# Altium footprint library PCBLIB.PcbLib: 775 footprints (part 33 of 49)
Each footprint in its own frame and in the unit in brackets; x right, y up, seen from the top. Pads: shape width x height; smd on the part's side, far side on the other; paste and mask are expansions set on the pad; w line width, h text height; cw(c..) or ccw(c..) is an arc to the next point about the centre after c.
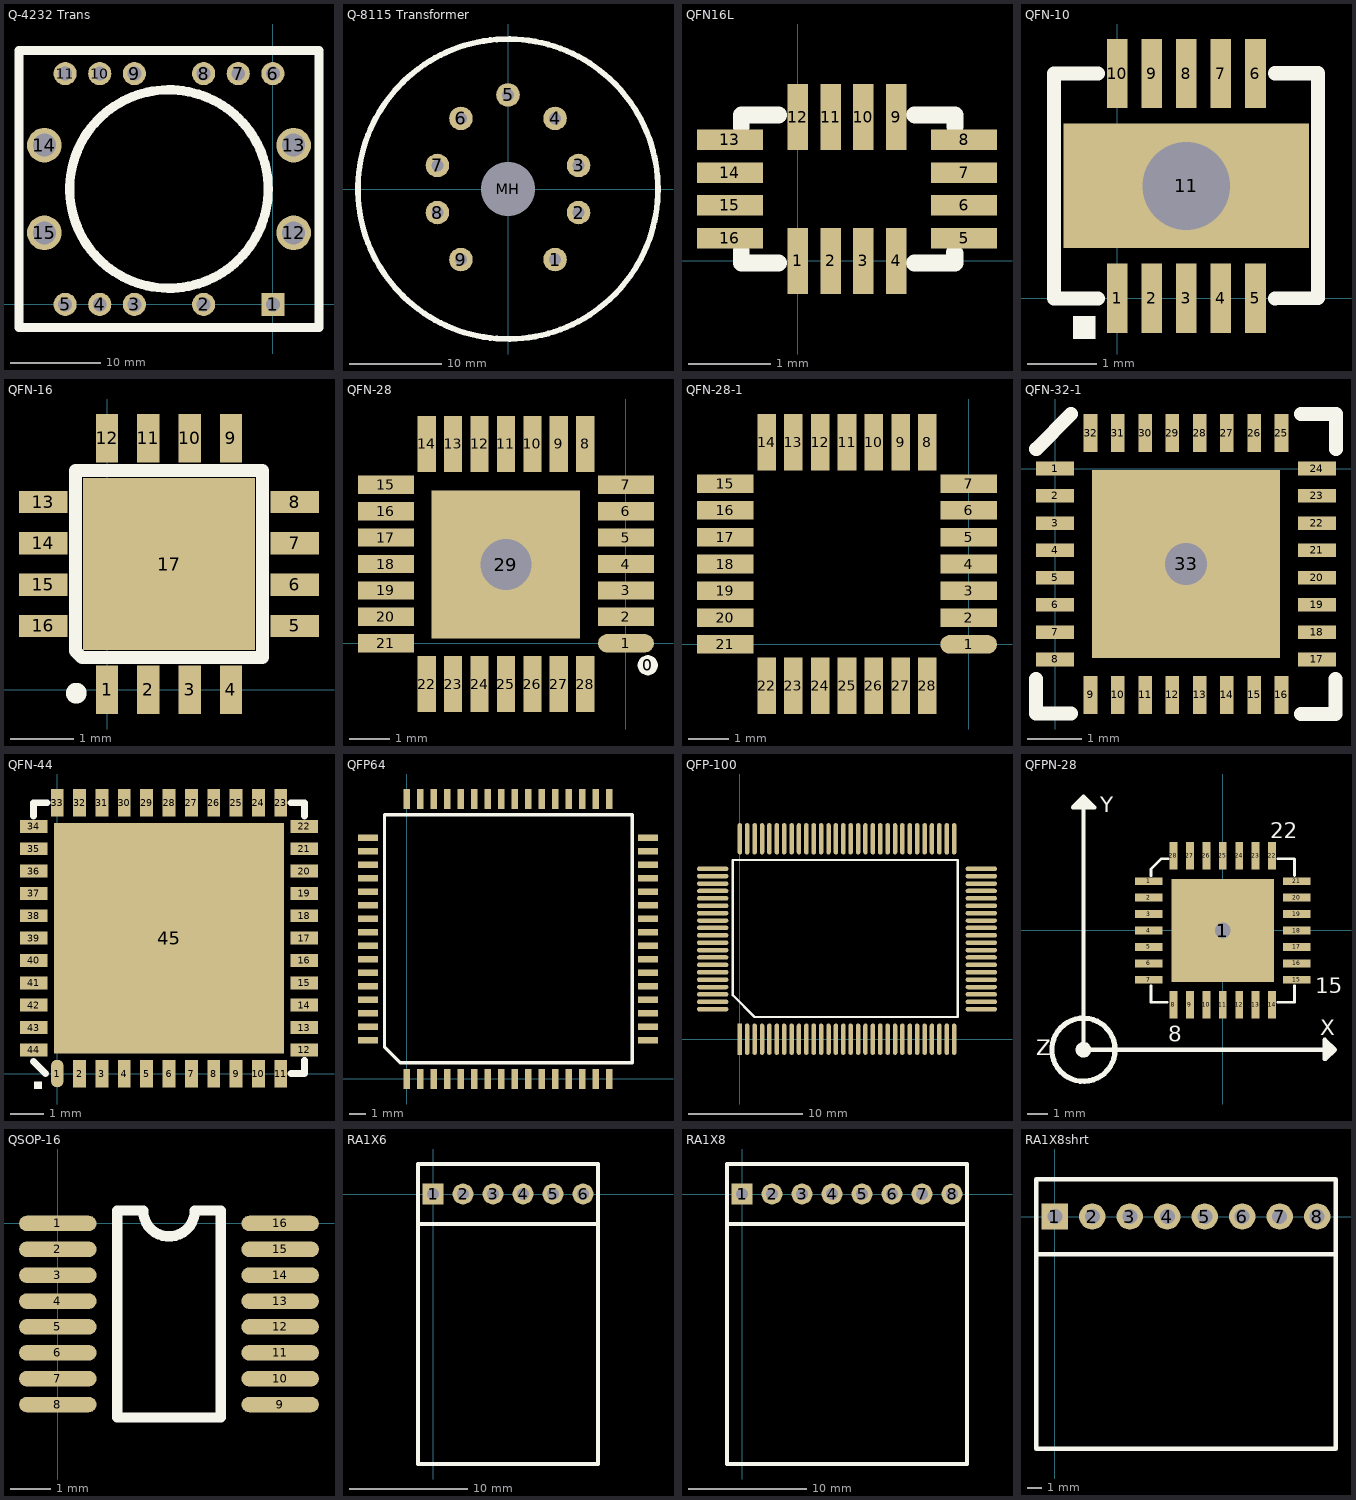
[diagram p32: the footprints below, top view; thin cyan lines are the x and y axes]

## Q-4232 Trans [mil]
pads (15):
  rect 100x100 hole 60: 1(0,0)
  round 100 hole 60: 2(-300,0) 3(-600,0) 4(-750,0) 5(-900,0) 6(0,1000) 7(-150,1000) 8(-300,1000) 9(-600,1000) 10(-750,1000) 11(-900,1000)
  round 150 hole 100: 12(90,310) 13(90,690) 14(-990,690) 15(-990,310)
TopOverlay:
  circle w40: c-450,500 r430
  lines w40: -1100,-100 -1100,1100 200,1100 200,-100 -1100,-100
Mechanical4:
  text "1.188" at 0,0 h1

## Q-8115 Transformer [mil] "Pot Core Audio Transformer with Additional Impedance Taps"
pads (10):
  round 100 hole 50: 1(200,-300) 2(300,-100) 3(300,100) 4(200,300) 5(0,400) 6(-200,300) 7(-300,100) 8(-300,-100) 9(-200,-300)
  round 100 hole 230 unplated: MH(0,0)
TopOverlay:
  circle w24: c0,0 r637.8
  text "." at 278,-379 h90
Mechanical4:
  text ".895" at 710,-140 h1

## QFN16L [mm]
height 0.45
pads (16):
  rect 0.25x0.8 smd: 1(0,0) 2(0.4,0) 3(0.8,0) 4(1.2,0) 9(1.2,1.75) 10(0.8,1.75) 11(0.4,1.75) 12(0,1.75)
  rect 0.8x0.25 smd: 5(2.025,0.275) 6(2.025,0.675) 7(2.025,1.075) 8(2.025,1.475) 13(-0.825,1.475) 14(-0.825,1.075) 15(-0.825,0.675) 16(-0.825,0.275)
TopOverlay:
  lines w0.203: -0.686,0.127 -0.686,-0.025 ; -0.686,1.626 -0.686,1.775 -0.232,1.775 -0.229,1.778 ; 1.422,1.778 1.425,1.775 1.914,1.775 1.914,1.635 ; 1.905,0.102 1.914,0.092 1.914,-0.025 1.423,-0.025 ; -0.686,-0.025 -0.685,-0.025 ; -0.685,-0.025 -0.559,-0.025 -0.229,-0.025 ; -0.229,-0.025 -0.229,-0.025 ; 1.422,-0.025 1.423,-0.025
  text "." at -0.457,-0.483 h0.76

## QFN-10 [mm]
height 1.016
pads (11):
  rect 0.3x1 smd: 1(0,0) 2(0.5,0) 3(1,0) 4(1.5,0) 5(2,0) 6(2,3.25) 7(1.5,3.25) 8(1,3.25) 9(0.5,3.25) 10(0,3.25)
  rect 3.556x1.8 / inner round 1.27 / far side round 1.778 hole 1.27: 11(1,1.625)
TopOverlay:
  rectangle: -0.635,-0.588 -0.311,-0.254
  lines w0.203: -0.28,0 -0.914,0.001 -0.914,3.249 -0.28,3.25 ; 2.28,0 2.905,0.005 2.905,3.255 2.281,3.255

## QFN-16 [mm]
height 1.016
pads (17):
  rect 0.35x0.76 smd: 1(0,0) 2(0.65,0) 3(1.3,0) 4(1.95,0) 9(1.95,3.96) 10(1.3,3.96) 11(0.65,3.96) 12(0,3.96)
  rect 0.76x0.35 smd: 5(2.955,1.005) 6(2.955,1.655) 7(2.955,2.305) 8(2.955,2.955) 13(-1.005,2.955) 14(-1.005,2.305) 15(-1.005,1.655) 16(-1.005,1.005)
  rect 2.7x2.7 smd: 17(0.975,1.98)
TopOverlay:
  circle w0.254: c-0.483,-0.052 r0.036
  lines w0.203: -0.498,0.61 -0.397,0.507 2.448,0.507 2.448,3.453 -0.498,3.453 -0.498,0.61

## QFN-28 [mil] "PIC16F87XA"
height 40
pads (30):
  round 20 on Top Overlay: 0(21.5,-21.55)
  oval 55x18 smd: 1(0,0)
  rect 55x18 smd: 2(0,26) 3(0,52) 4(0,78) 5(0,104) 6(0,130) 7(0,156) 15(-236,156) 16(-236,130) 17(-236,104) 18(-236,78) 19(-236,52) 20(-236,26) 21(-236,0)
  rect 18x55 smd: 8(-40,196) 9(-66,196) 10(-92,196) 11(-118,196) 12(-144,196) 13(-170,196) 14(-196,196) 22(-196,-40) 23(-170,-40) 24(-144,-40) 25(-118,-40) 26(-92,-40) 27(-66,-40) 28(-40,-40)
  rect 146x146 / inner round 50 / far side round 50 hole 50: 29(-118,77.5)

## QFN-28-1 [mil] "PIC16F87XA"
height 40
pads (28):
  oval 55x18 smd: 1(0,0)
  rect 55x18 smd: 2(0,26) 3(0,52) 4(0,78) 5(0,104) 6(0,130) 7(0,156) 15(-236,156) 16(-236,130) 17(-236,104) 18(-236,78) 19(-236,52) 20(-236,26) 21(-236,0)
  rect 18x55 smd: 8(-40,196) 9(-66,196) 10(-92,196) 11(-118,196) 12(-144,196) 13(-170,196) 14(-196,196) 22(-196,-40) 23(-170,-40) 24(-144,-40) 25(-118,-40) 26(-92,-40) 27(-66,-40) 28(-40,-40)

## QFN-32-1 [mm]
pads (33):
  rect 0.7x0.25 smd: 1(0,0) 2(0,-0.5) 3(0,-1) 4(0,-1.5) 5(0,-2) 6(0,-2.5) 7(0,-3) 8(0,-3.5) 17(4.8,-3.5) 18(4.8,-3) 19(4.8,-2.5) 20(4.8,-2) 21(4.8,-1.5) 22(4.8,-1) 23(4.8,-0.5) 24(4.8,0)
  rect 0.25x0.7 smd: 9(0.65,-4.15) 10(1.15,-4.15) 11(1.65,-4.15) 12(2.15,-4.15) 13(2.65,-4.15) 14(3.15,-4.15) 15(3.65,-4.15) 16(4.15,-4.15) 25(4.15,0.65) 26(3.65,0.65) 27(3.15,0.65) 28(2.65,0.65) 29(2.15,0.65) 30(1.65,0.65) 31(1.15,0.65) 32(0.65,0.65)
  rect 3.45x3.45 / inner round 1.27 / far side rect 1.27x1.27 hole 0.762: 33(2.4,-1.75)
TopOverlay:
  lines w0.254: -0.35,-3.86 -0.35,-4.49 0.29,-4.49 ; -0.35,0.36 -0.34,0.36 0.29,1 ; 4.51,-4.5 5.14,-4.5 5.14,-3.86 ; 4.51,1 5.15,1 5.15,0.36
  text "." at -0.53,0.94 h1.52

## QFN-44 [mil]
height 40
pads (45):
  oval 15x32 smd: 1(0,0)
  rect 15x32 smd: 2(26,0) 3(52,0) 4(78,0) 5(104,0) 6(130,0) 7(156,0) 8(182,0) 9(208,0) 10(234,0) 11(260,0) 23(260,315) 24(234,315) 25(208,315) 26(182,315) 27(156,315) 28(130,315) 29(104,315) 30(78,315) 31(52,315) 32(26,315) 33(0,315)
  rect 32x15 smd: 12(287.5,27.5) 13(287.5,53.5) 14(287.5,79.5) 15(287.5,105.5) 16(287.5,131.5) 17(287.5,157.5) 18(287.5,183.5) 19(287.5,209.5) 20(287.5,235.5) 21(287.5,261.5) 22(287.5,287.5) 34(-27.5,287.5) 35(-27.5,261.5) 36(-27.5,235.5) 37(-27.5,209.5) 38(-27.5,183.5) 39(-27.5,157.5) 40(-27.5,131.5) 41(-27.5,105.5) 42(-27.5,79.5) 43(-27.5,53.5) 44(-27.5,27.5)
  rect 268x268 smd: 45(130,157.5)
TopOverlay:
  rectangle: -27,-18 -18,-9
  lines w8: -27.5,299.5 -27.5,315 -12,315 ; 272,0 287.5,0 287.5,15.5 ; 272,315 287.5,315 287.5,299.5 ; -27.5,14 -13.5,0 -27.5,14

## QFP64 [mm]
height 1.016
pads (64):
  rect 0.4x1.2 smd: 1(0,0) 2(0.8,0) 3(1.6,0) 4(2.4,0) 5(3.2,0) 6(4,0) 7(4.8,0) 8(5.6,0) 9(6.4,0) 10(7.2,0) 11(8,0) 12(8.8,0) 13(9.6,0) 14(10.4,0) 15(11.2,0) 16(12,0) 33(12,16.6) 34(11.2,16.6) 35(10.4,16.6) 36(9.6,16.6) 37(8.8,16.6) 38(8,16.6) 39(7.2,16.6) 40(6.4,16.6) 41(5.6,16.6) 42(4.8,16.6) 43(4,16.6) 44(3.2,16.6) 45(2.4,16.6) 46(1.6,16.6) 47(0.8,16.6) 48(0,16.6)
  rect 1.2x0.4 smd: 17(14.3,2.3) 18(14.3,3.1) 19(14.3,3.9) 20(14.3,4.7) 21(14.3,5.5) 22(14.3,6.3) 23(14.3,7.1) 24(14.3,7.9) 25(14.3,8.7) 26(14.3,9.5) 27(14.3,10.3) 28(14.3,11.1) 29(14.3,11.9) 30(14.3,12.7) 31(14.3,13.5) 32(14.3,14.3) 49(-2.3,14.3) 50(-2.3,13.5) 51(-2.3,12.7) 52(-2.3,11.9) 53(-2.3,11.1) 54(-2.3,10.3) 55(-2.3,9.5) 56(-2.3,8.7) 57(-2.3,7.9) 58(-2.3,7.1) 59(-2.3,6.3) 60(-2.3,5.5) 61(-2.3,4.7) 62(-2.3,3.9) 63(-2.3,3.1) 64(-2.3,2.3)
TopOverlay:
  lines w0.2: -1.329,1.901 -1.329,15.666 13.381,15.666 13.381,0.956 -0.384,0.956 -1.329,1.901
  text "." at -0.127,1.422 h1.52

## QFP-100 [mm]
pads (100):
  rect 0.4x2.76 smd: 1(0,0)
  oval 0.4x2.76 smd: 2(0.65,0) 3(1.3,0) 4(1.95,0) 5(2.6,0) 6(3.25,0) 7(3.9,0) 8(4.55,0) 9(5.2,0) 10(5.85,0) 11(6.5,0) 12(7.15,0) 13(7.8,0) 14(8.45,0) 15(9.1,0) 16(9.75,0) 17(10.4,0) 18(11.05,0) 19(11.7,0) 20(12.35,0) 21(13,0) 22(13.65,0) 23(14.3,0) 24(14.95,0) 25(15.6,0) 26(16.25,0) 27(16.9,0) 28(17.55,0) 29(18.2,0) 30(18.85,0) 51(18.85,17.63) 52(18.2,17.63) 53(17.55,17.63) 54(16.9,17.63) 55(16.25,17.63) 56(15.6,17.63) 57(14.95,17.63) 58(14.3,17.63) 59(13.65,17.63) 60(13,17.63) 61(12.35,17.63) 62(11.7,17.63) 63(11.05,17.63) 64(10.4,17.63) 65(9.75,17.63) 66(9.1,17.63) 67(8.45,17.63) 68(7.8,17.63) 69(7.15,17.63) 70(6.5,17.63) 71(5.85,17.63) 72(5.2,17.63) 73(4.55,17.63) 74(3.9,17.63) 75(3.25,17.63) 76(2.6,17.63) 77(1.95,17.63) 78(1.3,17.63) 79(0.65,17.63) 80(0,17.63)
  oval 2.76x0.4 smd: 31(21.24,2.64) 32(21.24,3.29) 33(21.24,3.94) 34(21.24,4.59) 35(21.24,5.24) 36(21.24,5.89) 37(21.24,6.54) 38(21.24,7.19) 39(21.24,7.84) 40(21.24,8.49) 41(21.24,9.14) 42(21.24,9.79) 43(21.24,10.44) 44(21.24,11.09) 45(21.24,11.74) 46(21.24,12.39) 47(21.24,13.04) 48(21.24,13.69) 49(21.24,14.34) 50(21.24,14.99) 81(-2.39,14.99) 82(-2.39,14.34) 83(-2.39,13.69) 84(-2.39,13.04) 85(-2.39,12.39) 86(-2.39,11.74) 87(-2.39,11.09) 88(-2.39,10.44) 89(-2.39,9.79) 90(-2.39,9.14) 91(-2.39,8.49) 92(-2.39,7.84) 93(-2.39,7.19) 94(-2.39,6.54) 95(-2.39,5.89) 96(-2.39,5.24) 97(-2.39,4.59) 98(-2.39,3.94) 99(-2.39,3.29) 100(-2.39,2.64)
TopOverlay:
  lines w0.2: -0.627,3.878 -0.627,15.763 19.173,15.763 19.173,1.963 1.288,1.963 -0.627,3.878

## QFPN-28 [mil]
height 71
pads (30):
  rect 53x15 smd: 1(-142,94) 2(-142,62.5) 3(-142,31) 4(-142,-0.5) 5(-142,-32) 6(-142,-63.5) 7(-142,-95) 15(142,-95) 16(142,-63.5) 17(142,-32) 18(142,-0.5) 19(142,31) 20(142,62.5) 21(142,94)
  rect 197x197 smd: 1(0,-0.5)
  round 55 hole 30: 1(0,-0.5)
  rect 15x53 smd: 8(-94.5,-142.5) 9(-63,-142.5) 10(-31.5,-142.5) 11(0,-142.5) 12(31.5,-142.5) 13(63,-142.5) 14(94.5,-142.5) 22(94.5,142.5) 23(63,142.5) 24(31.5,142.5) 25(0,142.5) 26(-31.5,142.5) 27(-63,142.5) 28(-94.5,142.5)
TopOverlay:
  circle w10: c-267,-229 r60.54
  circle w10: c-267,-229 r6.08
  circle w10: c-267,-229 r10
  lines w5: -137.5,-106.5 -137.5,-138 -107,-138 ; -137.5,104.5 -137.5,117.5 -118,137 -105,137 ; 105,-138 137.5,-138 137.5,-106 ; 105,137 137,137 137.5,136.5 137.5,105
  lines w8: -281.97,241.03 -259.03,241.03 -259,241 ; -274.3,248.7 -273.63,248.02 -259.02,248.02 ; 195,-238 204,-229 205,-229 195,-219 ; -267,256 -246,235 -287,235 -287.29,235.71 -267,256 ; -267,256 -267,-229 215,-229 ; 215,-229 197,-247 195,-247 195,-210 196,-210 215,-229
  text "Z" at -358,-240 h30
  text "X" at 187,-201 h30
  text "Y" at -235,226 h30
  text "." at -194,94 h30
  text "15" at 177,-121 h30
  text "8" at -105,-214 h30
  text "22" at 91,176 h30

## QSOP-16 [mil]
height 70
pads (16):
  oval 75x15 smd: 1(0,0) 2(0,-25) 3(0,-50) 4(0,-75) 5(0,-100) 6(0,-125) 7(0,-150) 8(0,-175) 9(215,-175) 10(215,-150) 11(215,-125) 12(215,-100) 13(215,-75) 14(215,-50) 15(215,-25) 16(215,0)
TopOverlay:
  lines w10: 57.5,-187.5 57.5,12.5 82.5,12.5 ccw(c107.5,12.5) 132.5,12.5 157.5,12.5 157.5,-187.5 57.5,-187.5

## RA1X6 [mil]
pads (6):
  rect 70x70 hole 40: 1(0,0)
  round 70 hole 40: 2(100,0) 3(200,0) 4(300,0) 5(400,0) 6(500,0)
TopOverlay:
  lines w12: 550,-100 -50,-100 -50,100 ; -50,100 -50,-900 550,-900 550,100 -50,100
Mechanical4:
  text ".4" at 0,0 h1

## RA1X8 [mil]
pads (8):
  rect 70x70 hole 40: 1(0,0)
  round 70 hole 40: 2(100,0) 3(200,0) 4(300,0) 5(400,0) 6(500,0) 7(600,0) 8(700,0)
TopOverlay:
  lines w12: -50,-100 750,-100 ; -50,-900 750,-900 750,100 -50,100 -50,-900
Mechanical4:
  text ".4" at 0,0 h1

## RA1X8shrt [mil]
pads (8):
  rect 70x70 hole 40: 1(0,0)
  round 70 hole 40: 2(100,0) 3(200,0) 4(300,0) 5(400,0) 6(500,0) 7(600,0) 8(700,0)
TopOverlay:
  lines w12: -50,100 700,100 750,100 ; -50,100 -50,-620 750,-620 750,100 ; -50,100 -50,-100 750,-100 750,100
Mechanical4:
  text ".4" at 0,0 h1